# Altium integrated library myIOT_lib.IntLib: 300 symbols (part 1 of 3)
Pins are listed as number, name and electrical type; pins without a type are passive.

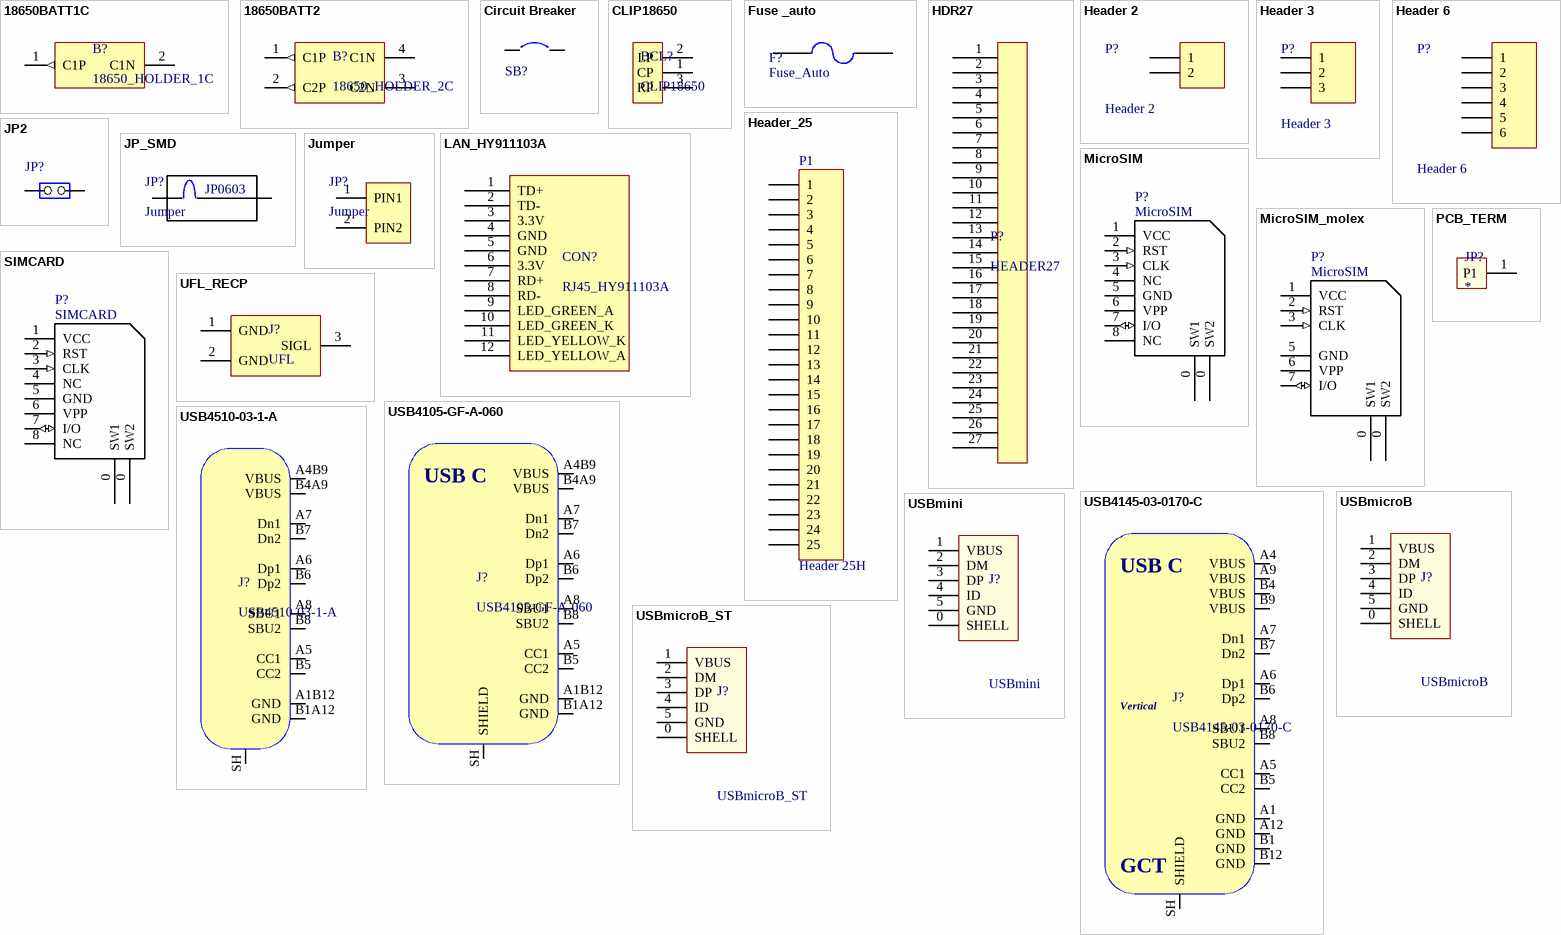
[diagram p0: symbols 18650BATT1C to USBmini]

## 18650BATT1C
designator B?, comment 18650_HOLDER_1C
18650 Battery 1 Cell Holder SMD
footprint 18650BAT1C_SMD (Battery 18650 Holder 1 Cell)
pins: 1 C1P (out), 2 C1N

## 18650BATT2
designator B?, comment 18650_HOLDER_2C
18650 Battery 2 Cell Holder SMD
footprint 18650BATT2 (18650 Battery Holder 2 Cell)
pins: 1 C1P (out), 2 C2P (out), 3 C2N, 4 C1N

## Circuit Breaker
designator SB?  (value not drawn)
Solder: NO; Published: 24-Mar-1999; Revision: July-2002: Re-released for DXP Platform.; Publisher: Altium Limited
footprint SPST-2 (Circuit Breaker; 2 Leads)
footprint JP2_SMD
pins: 1, 2

## CLIP18650
designator BCL?
clip 18650
footprint CLIP18650 (battery clip 18650)
pins: 1 CP, 2 LP, 3 RP

## Fuse _auto
designator F?, comment Fuse_Auto
Automive Fuse Holder 19mm x5 mm; Published: 8-Jun-2000; LatestRevisionDate: 17-Jul-2002; LatestRevisionNote: Re-released for DXP Platform.; PackageReference: PIN-W2/E2.8; Publisher: Altium Limited; PackageDescription: Thru-Hole; 2 Leads
footprint Keystone_3557-2 (Automotive Fuse Holder 19mmx5mm)
pins: 1 IN, 2 OUT

## HDR27
designator P?, comment HEADER27
footprint HDR27 (2.54mm pitch HEADER)
pins: 1, 2, 3, 4, 5, 6, 7, 8, 9, 10, 11, 12, 13, 14, 15, 16, 17, 18, 19, 20, 21, 22, 23, 24, 25, 26, 27

## Header 2
designator P?
Header, 2-Pin; LatestRevisionDate: 17-Jul-2002; LatestRevisionNote: Re-released for DXP Platform.; Publisher: Altium Limited
footprint B2B-XH-A (WAFER Connector 2 Pins,Pitch 2.50mm, Straight Type  Single Row)
pins: 1, 2

## Header 3
designator P?
Header, 3-Pin; LatestRevisionDate: 17-Jul-2002; LatestRevisionNote: Re-released for DXP Platform.; Publisher: Altium Limited
footprint B3B-XH-A (WAFER Connector 3 Pins,Pitch 2.50mm, Straight Type  Single Row)
pins: 1, 2, 3

## Header 6
designator P?
Header, 6-Pin; LatestRevisionDate: 17-Jul-2002; LatestRevisionNote: Re-released for DXP Platform.; Publisher: Altium Limited
footprint B6B-XH-A (WAFER Connector 6 Pins,Pitch 2.50mm, Straight Type  Single Row)
pins: 1, 2, 3, 4, 5, 6

## Header_25
designator P1, comment Header 25H
Header, 25-Pin; LatestRevisionDate: 17-Jul-2002; LatestRevisionNote: Re-released for DXP Platform.; Publisher: Altium Limited
footprint HDR1X25M (Connector; Header; 25 Position)
pins: 1, 2, 3, 4, 5, 6, 7, 8, 9, 10, 11, 12, 13, 14, 15, 16, 17, 18, 19, 20, 21, 22, 23, 24, 25

## JP2
designator JP?
footprint SIP2/2.54
pins: 1 COMMON, 2 NO

## JP_SMD
designator JP?, comment Jumper  (net tie, no BOM)
Jumper SMD 0603 size
footprint JP0603 (Jumper Body 1.6 x 0.8 mm (LxW typ))
pins: 1 P1, 2 P2
text: JP0603

## Jumper
designator JP?
Small Jumper for (M) pin header pitch 2.0mm
footprint JUMPER2.0p (mini jumper pitch 2.0mm)
pins: 1 PIN1, 2 PIN2

## LAN_HY911103A
designator CON?, comment RJ45_HY911103A
ConnectorRJ45 Magnetic with 2 LEDfor 10/100; Anunda_Code: N2311
footprint LAN_HY911103A
pins: 1 TD+  , 2 TD-, 3 3.3V, 4 GND, 5 GND, 6 3.3V, 7 RD+, 8 RD-, 9 LED_GREEN_A, 10 LED_GREEN_K, 11 LED_YELLOW_K, 12 LED_YELLOW_A

## MicroSIM
designator P?
Connector for Micro SIM card ,8 pin, 1.27 mm pitch PCB SMT; MFG: AUK CONNECTOR; MFG P/N: SCPW06L20020-R5H-HCN; Anunda_Code: N1986; Price: 13.26; Supplier: AUK
footprint WE-693022010811 (8-pos Connector Micro SIM SMD, R/A ,Hinged Lid,Wurth Electronics)
pins: 0 SW1 (power), 0 SW2 (power), 1 VCC (power), 2 RST (in), 3 CLK (in), 4 NC, 5 GND (power), 6 VPP (power), 7 I/O (io), 8 NC

## MicroSIM_molex
designator P?, comment MicroSIM
Connector Micro SIM Card Hinged Lid 6-Contact 1.6mm Height; MFG: AUK CONNECTOR; MFG P/N: SCPW06L20020-R5H-HCN; Anunda_Code: D0920; Price: 13.26; Supplier: AUK
footprint MOLEX-788000001
pins: 0 SW1 (power), 0 SW2 (power), 1 VCC (power), 2 RST (in), 3 CLK (in), 5 GND (power), 6 VPP (power), 7 I/O (io)

## PCB_TERM
designator JP?
footprint PCB_TERM_TAB635
pins: 1 P1

## SIMCARD
designator P?
Connector for Multipole SIM card ,6 pin, 1.27 mm pitch PCB SMT; MFG: AUK CONNECTOR; MFG P/N: SCPW06L20020-R5H-HCN; Anunda_Code: N1025; Price: 13.26; Supplier: AUK
footprint MOLEX-0475532001 (Push-push SIM Socket)
pins: 0 SW1 (power), 0 SW2 (power), 1 VCC (power), 2 RST (in), 3 CLK (in), 4 NC, 5 GND (power), 6 VPP (power), 7 I/O (io), 8 NC

## UFL_RECP
designator J?, comment UFL
Connector UMCC IPEX MHF1 Receptacle (M) SMD 50 Ohm; Anunda_Code: D0696
footprint UFL_recep_SMT
pins: 1 GND, 2 GND, 3 SIGL

## USB4105-GF-A-060
designator J?
USB Connector Type C SMT 12 Pin; Manufacturer: GCT; Manufacturer Part Number: USB4105-GF-A-060
footprint USB4105-GF-A-060
pins: A1B12 GND, A4B9 VBUS, A5 CC1, A6 Dp1, A7 Dn1, A8 SBU1, B1A12 GND, B4A9 VBUS, B5 CC2, B6 Dp2, B7 Dn2, B8 SBU2, SH SHIELD
text: USB C

## USB4145-03-0170-C
designator J?
USB Connector Type C SMT 16 Pin Vertical; Manufacturer: GCT; Manufacturer Part Number: USB4145-03-0170-C
footprint USB4145-03-0170-C
pins: A1 GND, A4 VBUS, A5 CC1, A6 Dp1, A7 Dn1, A8 SBU1, A9 VBUS, A12 GND, B1 GND, B4 VBUS, B5 CC2, B6 Dp2, B7 Dn2, B8 SBU2, B9 VBUS, B12 GND, SH SHIELD
text: USB C; Vertical

## USB4510-03-1-A
designator J?
USB Connector Type C SMT Mid-Mount 16 Pin; Manufacturer: GCT; Manufacturer Part Number: USB4510-03-1-A
footprint USB4510-03-1-A
pins: A1B12 GND, A4B9 VBUS, A5 CC1, A6 Dp1, A7 Dn1, A8 SBU1, B1A12 GND, B4A9 VBUS, B5 CC2, B6 Dp2, B7 Dn2, B8 SBU2, SH SHIELD

## USBmicroB
designator J?
Micro USB 2.0 ReceptacleType B Connector 5 Position, R/A(Digikey:609-4618-1-ND); Anunda_Code: N1953
footprint microUSB_ mix_amPN
pins: 0 SHELL, 1 VBUS, 2 DM, 3 DP, 4 ID, 5 GND

## USBmicroB_ST
designator J?
Micro USB 2.0 ReceptacleType B Connector 5 Position, S/T(105133-0001); Anunda_Code: N2253
footprint microUSB_ mix_Standoff
pins: 0 SHELL, 1 VBUS, 2 DM, 3 DP, 4 ID, 5 GND

## USBmini
designator J?
USB mini type B 5 pins receptacle
footprint MiniUSBtype B
pins: 0 SHELL, 1 VBUS, 2 DM, 3 DP, 4 ID, 5 GND


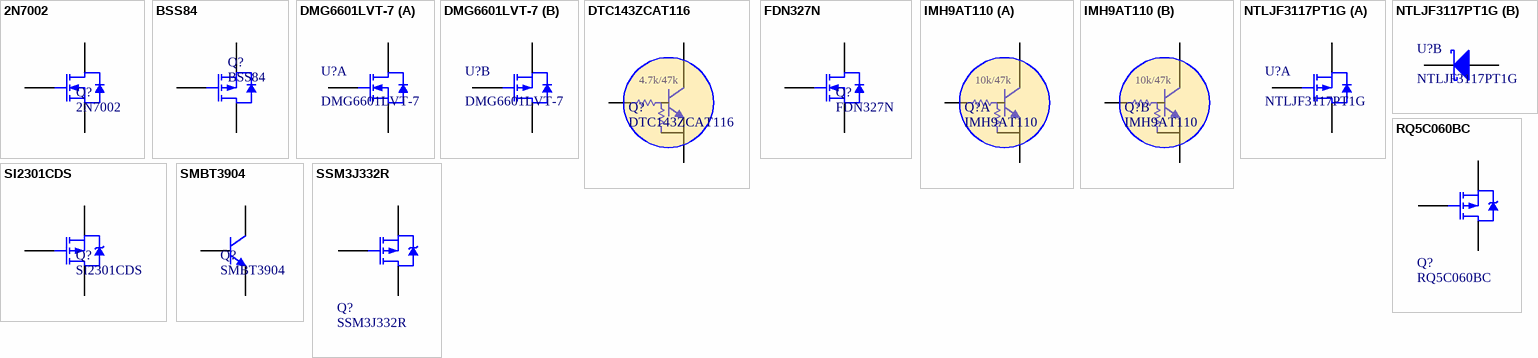
[diagram p1: symbols 2N7002 to SSM3J332R]

## 2N7002
designator Q?
N-channel Enhancement Mode Field-effect Transistor 2N7002; Anunda_Code: M1070; MFG: ON Semiconductor; MFG P/N: 2N7002LT1G; Published: 17-Sep-2003; LatestRevisionDate: 12-Dec-2006; LatestRevisionNote: IPC-7351 Footprint Added.; DatasheetVersion: 27-Jul-2000; PackageVersion: May-1999; PackageReference: SOT23; Publisher: Altium Limited; PackageDescription: 3-Pin SOT-23 Package 0.95 mm Pitch, 2.3 mm Lead Span; Value: 2N7002
simulation model 2N7002 (SUBCKT)
footprint SOT23_N_2
pins: 1 G, 2 S, 3 D

## BSS84
designator Q?
P-channel Enhancement Mode Vertical D-MOSFET BSS84; Anunda_Code: M1904; MFG: Nexperia USA Inc.; MFG P/N: BSS84AK,215; Published: 17-Sep-2003; LatestRevisionDate: 12-Dec-2006; LatestRevisionNote: IPC-7351 Footprint Added.; DatasheetVersion: 18-Jun-1997; PackageVersion: May-1999; PackageReference: SOT23; Publisher: Altium Limited; PackageDescription: 3-Pin SOT-23 Package 0.95 mm Pitch, 2.3 mm Lead Span; Value: BSS84
footprint SOT23_N_2
pins: 1 G, 2 S, 3 D

## DMG6601LVT-7
designator U?
DMG6601LVT-7COMPLEMENTARY PAIR ENHANCEMENT MODE MOSFET; Anunda_Code: M1914; MFG: Diode Incorporated; Value: DMG6601LVT-7; MFG P/N: DMG6601LVT-7
footprint SOT23-6
part A pins: 1 G1, 5 S1, 6 D1
part B pins: 2 S2, 3 G2, 4 D2

## DTC143ZCAT116
designator Q?
DTC143ZCAT116 / Digital Transistor NPN 50V/100mA, 200mW 4.7 kOhm and 47 kOhm Built-in Bias Resistors; Anunda_Code: M2034; ES P/N: 0176-1565-6; MFG: Rohm Semiconductor; Published: 17-Sep-2003; LatestRevisionDate: 12-Dec-2006; LatestRevisionNote: IPC-7351 Footprint Added.; DatasheetVersion: 13-May-2002; PackageVersion: May-1999; PackageReference: SOT23; Publisher: Altium Limited; PackageDescription: 3-Pin SOT-23 Package 0.95 mm Pitch, 2.3 mm Lead Span; Value: DTC143ZCAT116; MFG P/N: DTC143ZCAT116
footprint SOT23_N_2
pins: 1 B, 2 E, 3 C
text: 4.7k/47k

## FDN327N
designator Q?
Transistor FDN327N N-CH 20V 2A MOSFET 0.5W; Anunda_Code: M2008; MFG: ON Semiconductor; Published: 17-Sep-2003; LatestRevisionDate: 12-Dec-2006; LatestRevisionNote: IPC-7351 Footprint Added.; DatasheetVersion: 27-Jul-2000; PackageVersion: May-1999; PackageReference: SOT23; Publisher: Altium Limited; PackageDescription: 3-Pin SOT-23 Package 0.95 mm Pitch, 2.3 mm Lead Span; Value: FDN327N; MFG P/N: FDN327N
simulation model 2N7002 (SUBCKT)
footprint SOT23_N_2
pins: 1 G, 2 S, 3 D

## IMH9AT110
designator Q?
IMH9AT110 / Dual Digital Transistor NPN 50V/100mA,10kO and 47kO Built-in Bias Resistors; Anunda_Code: M2062; ES P/N: 0176-1565-6; MFG: Rohm Semiconductor; Published: 17-Sep-2003; LatestRevisionDate: 12-Dec-2006; LatestRevisionNote: IPC-7351 Footprint Added.; DatasheetVersion: 13-May-2002; PackageVersion: May-1999; PackageReference: SOT457-6; Publisher: Altium Limited; PackageDescription: 6-Pin SOT-457 Package 0.95 mm Pitch, 2.3 mm Lead Span; Value: IMH9AT110; MFG P/N: IMH9AT110
footprint SOT457-6 (SOT457, 6-Leads, Body 2.90x2.80mm, Pitch 0.95mm, IPC Medium Density)
part A pins: 2 B1, 3 E1, 4 C1
part B pins: 1 C2, 5 B2, 6 E2
part A text: 10k/47k
part B text: 10k/47k

## NTLJF3117PT1G
designator U?
Power MOSFET P-CH with Schottky Diode
footprint WDFN6_HS-7N (SON, 6-Leads, Body 2.00x2.00mm, Pitch 0.65mm, Thermal Pad 1.60x0.98mm, IPC Medium Density)
part A pins: 3 D, 4 S, 5 G
part B pins: 1 A, 6 K

## RQ5C060BC
designator Q?
P-Channel Power MOSFET RQ5C060BC; Note: Pin 4 not drawn and electrically connected to Pin 2.; Anunda_Code: M1937; MFG: Rohm Semiconductor; MFG P/N: RQ5C060BCTCL; Published: 8-Jun-2000; LatestRevisionDate: 17-Jul-2002; LatestRevisionNote: Re-released for DXP Platform.; DatasheetVersion: PD-9.390D; PackageVersion: Feb-1997; PackageReference: TO-220AB; Publisher: Altium Limited; PackageDescription: TO, Thru-Hole, Vertical, Heatsink Mounted; 3 In-Line Leads; Pitch 2.54 mm; Value: RQ5C060BC
simulation model IRF9510 (Spice Subcircuit)
footprint SOT-23(SOT-23-3)
pins: 1 G, 2 S, 3 D

## SI2301CDS
designator Q?
SI2301CDS  P-Channel 20V 3.1A (Tc) 860mW (Ta), 1.6W (Tc) Surface Mount SOT-23-3 (TO-236); Note: Pin 4 not drawn and electrically connected to Pin 2.; Published: 8-Jun-2000; LatestRevisionDate: 17-Jul-2002; LatestRevisionNote: Re-released for DXP Platform.; DatasheetVersion: PD-9.390D; PackageVersion: Feb-1997; PackageReference: TO-220AB; Publisher: Altium Limited; Digi-Key: SI2301CDS-T1-GE3CT-ND
footprint SOT23_N_2
pins: 1 G, 2 S, 3 D

## SMBT3904
designator Q?
NPN Switching Transistor  SMBT3904 SOT-23; Anunda_Code: M0292; MFG: Diode Incorporated; MFG P/N: MMBT3904-7-F; Published: 17-Sep-2003; LatestRevisionDate: 12-Dec-2006; LatestRevisionNote: IPC-7351 Footprint Added.; DatasheetVersion: 13-May-2002; PackageVersion: May-1999; PackageReference: SOT23; Publisher: Altium Limited; PackageDescription: 3-Pin SOT-23 Package 0.95 mm Pitch, 2.3 mm Lead Span; Value: SMBT3904
footprint SOT23_N_2
pins: 1 B, 2 E, 3 C

## SSM3J332R
designator Q?
P-Channel Power MOSFET 30V/6A SSM3J332R; Note: Pin 4 not drawn and electrically connected to Pin 2.; Anunda_Code: M2161; MFG: Toshiba Semiconductor and Storage; MFG P/N: SSM3J332R,LF; Published: 8-Jun-2000; LatestRevisionDate: 17-Jul-2002; LatestRevisionNote: Re-released for DXP Platform.; DatasheetVersion: PD-9.390D; PackageVersion: Feb-1997; PackageReference: SOT-23F; Publisher: Altium Limited; PackageDescription: TO, Thru-Hole, Vertical, Heatsink Mounted; 3 In-Line Leads; Pitch 2.54 mm; Value: SSM3J332R
simulation model IRF9510 (Spice Subcircuit)
footprint SOT-23(SOT-23-3)
pins: 1 G, 2 S, 3 D


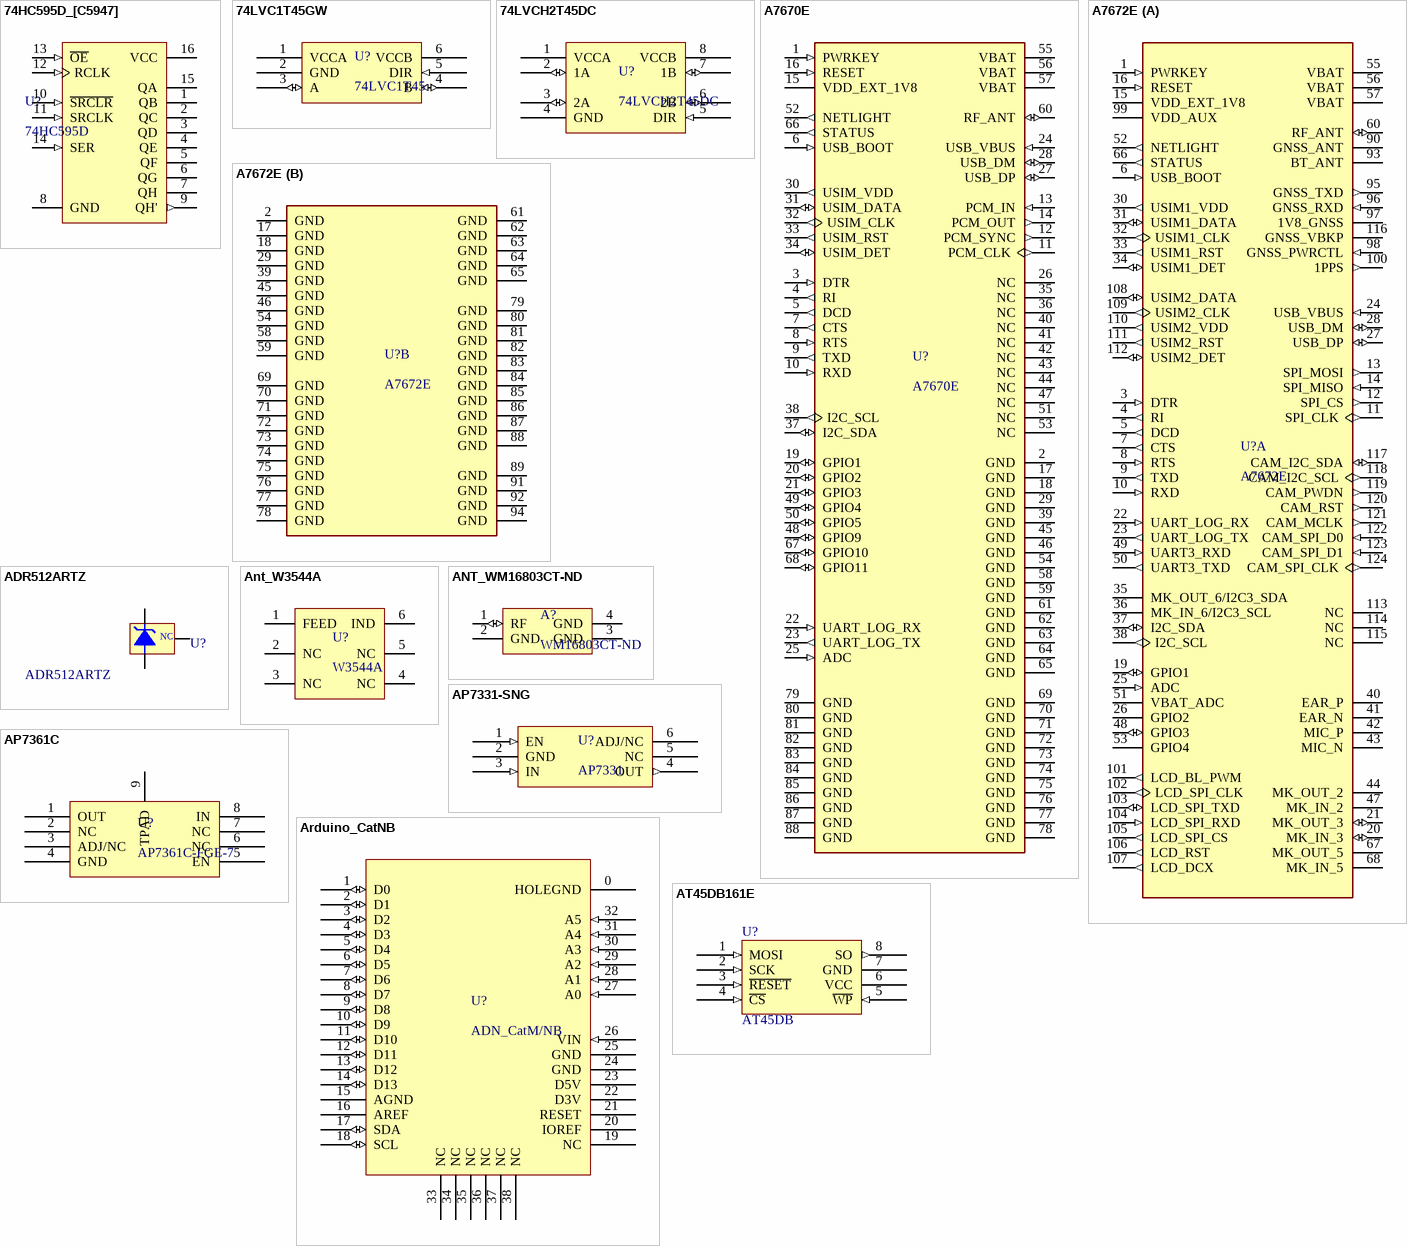
[diagram p2: symbols 74HC595D_[C5947] to AT45DB161E]

## 74HC595D_[C5947]
designator U?, comment 74HC595D
Package: SOIC-16_150mil; Supplier: LC; SuppliersPartNumber: C5947
footprint SOIC-16_150mil
pins: 1 QB (hiz), 2 QC (hiz), 3 QD (hiz), 4 QE (hiz), 5 QF (hiz), 6 QG (hiz), 7 QH (hiz), 8 GND (power), 9 QH' (out), 10 ~{SRCLR} (in), 11 SRCLK (in), 12 RCLK (in), 13 ~{OE} (in), 14 SER (in), 15 QA (hiz), 16 VCC (power)

## 74LVC1T45GW
designator U?, comment 74LVC1T45
IC 74LVC1T45GW-W100H Level Translator 6-TSSOP; Anunda_Code: M2037; DigiKey_PN:: 1727-8054-1-ND
footprint SOT363 (SOT363, 6-Leads, Body 2.00x2.10mm, Pitch 0.65mm, IPC Medium Density)
pins: 1 VCCA, 2 GND, 3 A (io), 4 B (io), 5 DIR (in), 6 VCCB

## 74LVCH2T45DC
designator U?
IC 74LVCH2T45DC-Q100H Level Translator VSSOP-8; DigiKey_PN:: 1727-8054-1-ND
footprint VSSOP-8 (TSSOP, 8-Leads, Body 2.00x2.30mm, Pitch 0.50mm, IPC Medium Density)
pins: 1 VCCA, 2 1A (io), 3 2A (io), 4 GND, 5 DIR (in), 6 2B (io), 7 1B (io), 8 VCCB

## A7670E
designator U?
4G LTE Module, SIMCOM A7670E; MP: A7670E; Package: None; MF: Simcom; Value: *; Price: None; SnapEDA_Link: https://www.snapeda.com/parts/SIM7600E-H/SIMcom%20Wireless%20solutions%20Co.%2CLtd/view-part/2758290/?ref=snap; Anunda_Code: *
footprint A7670X (LCC+LGA Package 88pin)
pins: 1 PWRKEY (in), 2 GND (power), 3 DTR (in), 4 RI (out), 5 DCD (out), 6 USB_BOOT (in), 7 CTS (out), 8 RTS (in), 9 TXD (out), 10 RXD (in), 11 PCM_CLK (out), 12 PCM_SYNC (out), 13 PCM_IN (in), 14 PCM_OUT (out), 15 VDD_EXT_1V8 (power), 16 RESET (in), 17 GND (power), 18 GND (power), 19 GPIO1 (io), 20 GPIO2 (io), 21 GPIO3 (io), 22 UART_LOG_RX (in), 23 UART_LOG_TX (out), 24 USB_VBUS (in), 25 ADC (in), 26 NC, 27 USB_DP (io), 28 USB_DM (io), 29 GND (power), 30 USIM_VDD (out), 31 USIM_DATA (io), 32 USIM_CLK (out), 33 USIM_RST (out), 34 USIM_DET (io), 35 NC, 36 NC, 37 I2C_SDA (io), 38 I2C_SCL (out), 39 GND (power), 40 NC, 41 NC, 42 NC, 43 NC, 44 NC, 45 GND (power), 46 GND (power), 47 NC, 48 GPIO9 (io), 49 GPIO4 (io), 50 GPIO5 (io), 51 NC, 52 NETLIGHT (out), 53 NC, 54 GND (power), 55 VBAT (power), 56 VBAT (power), 57 VBAT (power), 58 GND (power), 59 GND (power), 60 RF_ANT (io), 61 GND (power), 62 GND (power), 63 GND (power), 64 GND (power), 65 GND (power), 66 STATUS (out), 67 GPIO10 (io), 68 GPIO11 (io), 69 GND (power), 70 GND (power), 71 GND (power), 72 GND (power), 73 GND (power), 74 GND (power), 75 GND (power), 76 GND (power), 77 GND (power), 78 GND (power), 79 GND (power), 80 GND (power), 81 GND (power), 82 GND (power), 83 GND (power), 84 GND (power), 85 GND (power), 86 GND (power), 87 GND (power), 88 GND (power)

## A7672E
designator U?
4G LTE Module, SIMCOM A7672E; MP: A7672E; Package: None; MF: Simcom; Value: *; Price: None; SnapEDA_Link: https://www.snapeda.com/parts/SIM7600E-H/SIMcom%20Wireless%20solutions%20Co.%2CLtd/view-part/2758290/?ref=snap; Anunda_Code: *
footprint A7672X (LCC+LGA Package 124pin)
part A pins: 1 PWRKEY (in), 3 DTR (in), 4 RI (out), 5 DCD (out), 6 USB_BOOT (in), 7 CTS (out), 8 RTS (in), 9 TXD (out), 10 RXD (in), 11 SPI_CLK (out), 12 SPI_CS (out), 13 SPI_MOSI (out), 14 SPI_MISO (in), 15 VDD_EXT_1V8 (power), 16 RESET (in), 19 GPIO1 (io), 20 MK_IN_3 (io), 21 MK_OUT_3 (io), 22 UART_LOG_RX (in), 23 UART_LOG_TX (out), 24 USB_VBUS (in), 25 ADC (in), 26 GPIO2, 27 USB_DP (io), 28 USB_DM (io), 30 USIM1_VDD (out), 31 USIM1_DATA (io), 32 USIM1_CLK (out), 33 USIM1_RST (out), 34 USIM1_DET (io), 35 MK_OUT_6/I2C3_SDA, 36 MK_IN_6/I2C3_SCL, 37 I2C_SDA (io), 38 I2C_SCL (out), 40 EAR_P, 41 EAR_N, 42 MIC_P, 43 MIC_N, 44 MK_OUT_2, 47 MK_IN_2, 48 GPIO3 (io), 49 UART3_RXD (in), 50 UART3_TXD (out), 51 VBAT_ADC, 52 NETLIGHT (out), 53 GPIO4, 55 VBAT (power), 56 VBAT (power), 57 VBAT (power), 60 RF_ANT (io), 66 STATUS (out), 67 MK_OUT_5, 68 MK_IN_5, 90 GNSS_ANT (power), 93 BT_ANT (power), 95 GNSS_TXD (out), 96 GNSS_RXD (in), 97 1V8_GNSS (power), 98 GNSS_PWRCTL (in), 99 VDD_AUX (power), 100 1PPS (out), 101 LCD_BL_PWM (out), 102 LCD_SPI_CLK (out), 103 LCD_SPI_TXD (io), 104 LCD_SPI_RXD (in), 105 LCD_SPI_CS (out), 106 LCD_RST (out), 107 LCD_DCX (out), 108 USIM2_DATA (io), 109 USIM2_CLK (out), 110 USIM2_VDD (out), 111 USIM2_RST (out), 112 USIM2_DET (io), 113 NC, 114 NC, 115 NC, 116 GNSS_VBKP (power), 117 CAM_I2C_SDA (io), 118 CAM_I2C_SCL (out), 119 CAM_PWDN (out), 120 CAM_RST (out), 121 CAM_MCLK (out), 122 CAM_SPI_D0 (in), 123 CAM_SPI_D1 (in), 124 CAM_SPI_CLK (out)
part B pins: 2 GND (power), 17 GND (power), 18 GND (power), 29 GND (power), 39 GND (power), 45 GND (power), 46 GND (power), 54 GND (power), 58 GND (power), 59 GND (power), 61 GND (power), 62 GND (power), 63 GND (power), 64 GND (power), 65 GND (power), 69 GND (power), 70 GND (power), 71 GND (power), 72 GND (power), 73 GND (power), 74 GND (power), 75 GND (power), 76 GND (power), 77 GND (power), 78 GND (power), 79 GND (power), 80 GND (power), 81 GND (power), 82 GND (power), 83 GND (power), 84 GND (power), 85 GND (power), 86 GND (power), 87 GND (power), 88 GND (power), 89 GND (power), 91 GND (power), 92 GND (power), 94 GND (power)

## ADR512ARTZ
designator U?
ADR512ARTZ VRef Shunt Precision 1.2V SOT-23-3
footprint SOT23_N_2
pins: 1 K, 2 A, 3 NC

## Ant_W3544A
designator U?, comment W3544A
LTE Antenna (W3544A) 850-900/1710-2170MHz PCB Trace; Anunda_Code: N2212
footprint W3544A (PulseLarsen W3544A GSM/3G Antenna)
pins: 1 FEED, 2 NC, 3 NC, 4 NC, 5 NC, 6 IND

## ANT_WM16803CT-ND
designator A?, comment WM16803CT-ND
SMD Ant. molex WM16803CT-ND
footprint WM16803CT-ND (molex gps ant)
pins: 1 RF (io), 2 GND, 3 GND, 4 GND

## AP7331-SNG
designator U?, comment AP7331
300mA, LOW QUIESCENT CU  RRENT, FAST TRANSIENT   LOW DROPOUT LINEAR REGULATOR
footprint DFN2020-6_HS-7N (SON, 6-Leads, Body 2.01x2.01mm, Pitch 0.65mm, Thermal Pad 1.55x0.73mm, IPC Medium Density)
pins: 1 EN (in), 2 GND, 3 IN (in), 4 OUT (out), 5 NC, 6 ADJ/NC

## AP7361C
designator U?, comment AP7361C-FGE-7
AP7361C-FGE-7   Low Dropout Adjustable 1A Regulator; Anunda_Code: M1966; Value: AP7361C-FGE-7
footprint U-DFN3030-8 (SON, 8-Leads, Body 3.00x3.00mm, Pitch 0.65mm, Thermal Pad 2.25x1.34mm, IPC Medium Density)
pins: 1 OUT, 2 NC, 3 ADJ/NC, 4 GND, 5 EN, 6 NC, 7 NC, 8 IN, 9 TPAD

## Arduino_CatNB
designator U?, comment ADN_CatM/NB
Arduino Shield Cat.M1/NB
footprint ADN_NB (Arduino Shield Cat. M1/NB)
pins: 0 HOLEGND, 1 D0 (io), 2 D1 (io), 3 D2 (io), 4 D3 (io), 5 D4 (io), 6 D5 (io), 7 D6 (io), 8 D7 (io), 9 D8 (io), 10 D9 (io), 11 D10 (io), 12 D11 (io), 13 D12 (io), 14 D13 (io), 15 AGND, 16 AREF, 17 SDA (io), 18 SCL (io), 19 NC, 20 IOREF, 21 RESET, 22 D3V (power), 23 D5V (power), 24 GND, 25 GND, 26 VIN (in), 27 A0 (in), 28 A1 (in), 29 A2 (in), 30 A3 (in), 31 A4 (in), 32 A5 (in), 33 NC, 34 NC, 35 NC, 36 NC, 37 NC, 38 NC

## AT45DB161E
designator U?, comment AT45DB
AT45DB161E-SUD-T Flash Memory 16M, 2.5-3.6V SPI SOIC-8; Anunda_Code: M1909
footprint SOIC-8_208mil
pins: 1 MOSI (in), 2 SCK (in), 3 ~{RESET} (in), 4 ~{CS} (in), 5 ~{WP} (in), 6 VCC (power), 7 GND, 8 SO (out)

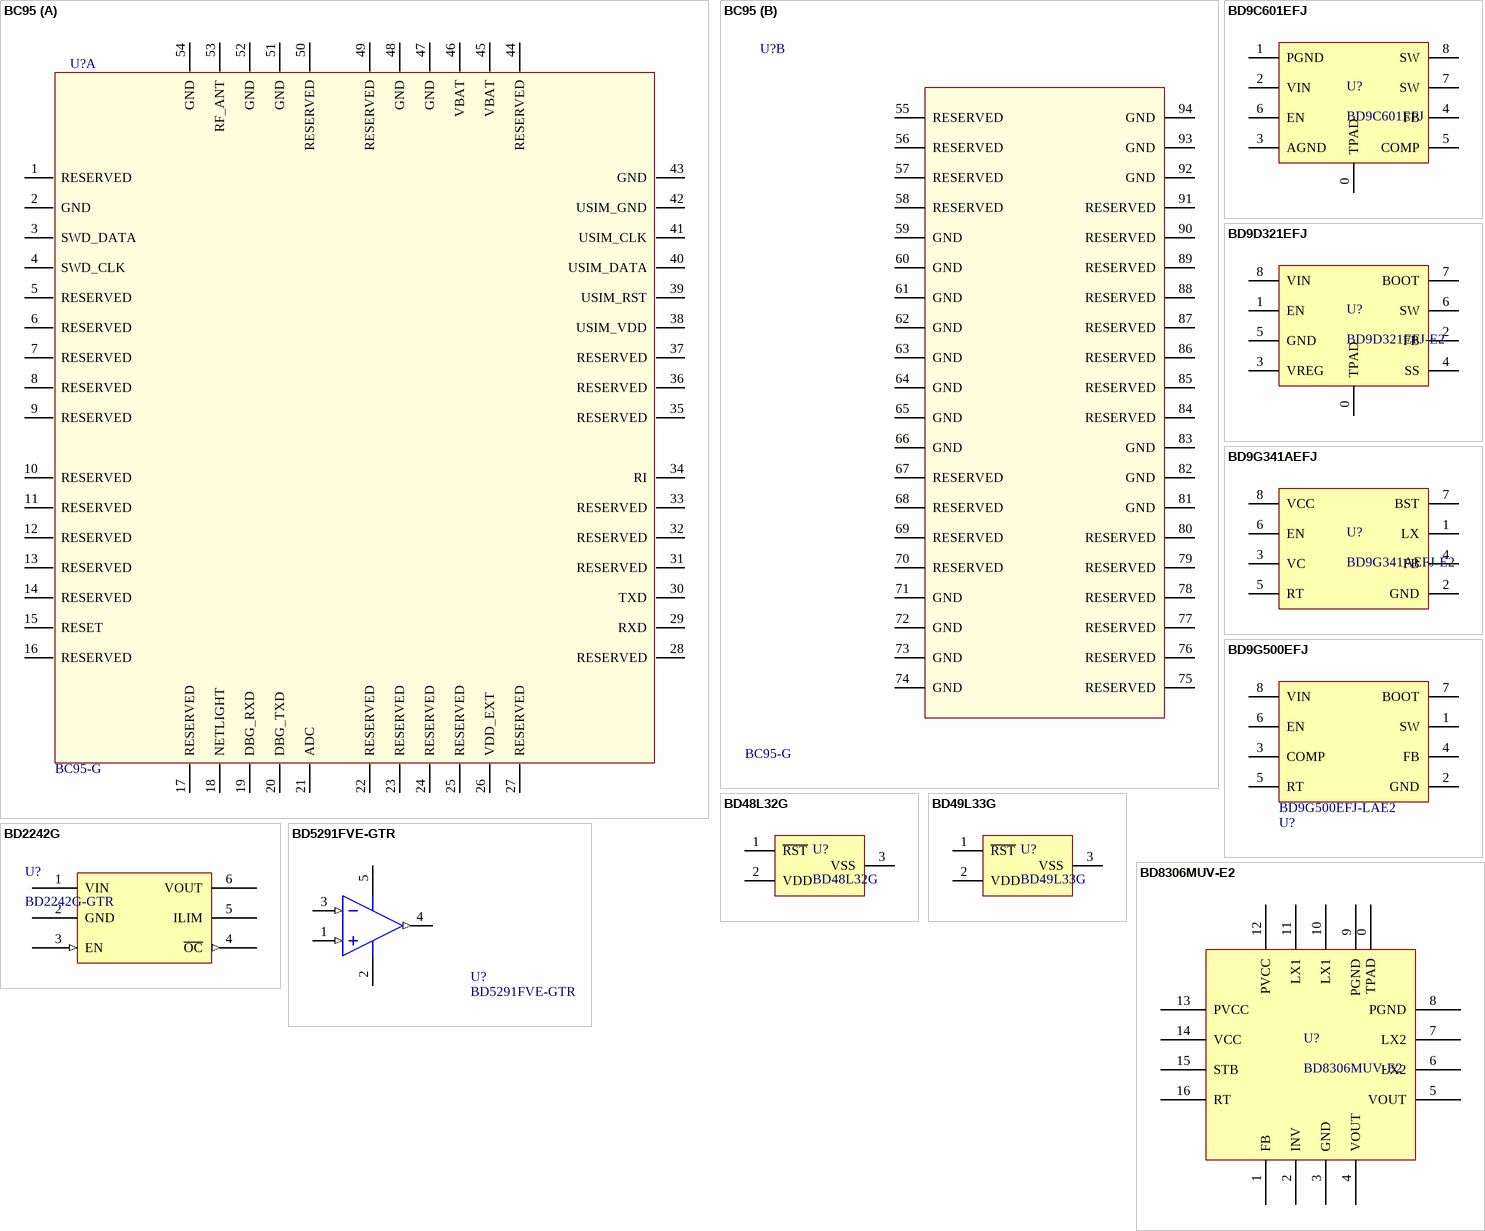
[diagram p3: symbols BC95 to BD8306MUV-E2]

## BC95
designator U?, comment BC95-G
LTE  NB-IoT Module, Model : BC95-G, Quectel; Anunda_Code: N2123; Value: *; Part Description: *; PCB DECAL: *
footprint BC95
part A pins: 1 RESERVED, 2 GND, 3 SWD_DATA, 4 SWD_CLK, 5 RESERVED, 6 RESERVED, 7 RESERVED, 8 RESERVED, 9 RESERVED, 10 RESERVED, 11 RESERVED, 12 RESERVED, 13 RESERVED, 14 RESERVED, 15 RESET, 16 RESERVED, 17 RESERVED, 18 NETLIGHT, 19 DBG_RXD, 20 DBG_TXD, 21 ADC, 22 RESERVED, 23 RESERVED, 24 RESERVED, 25 RESERVED, 26 VDD_EXT, 27 RESERVED, 28 RESERVED, 29 RXD, 30 TXD, 31 RESERVED, 32 RESERVED, 33 RESERVED, 34 RI, 35 RESERVED, 36 RESERVED, 37 RESERVED, 38 USIM_VDD, 39 USIM_RST, 40 USIM_DATA, 41 USIM_CLK, 42 USIM_GND, 43 GND, 44 RESERVED, 45 VBAT, 46 VBAT, 47 GND, 48 GND, 49 RESERVED, 50 RESERVED, 51 GND, 52 GND, 53 RF_ANT, 54 GND
part B pins: 55 RESERVED, 56 RESERVED, 57 RESERVED, 58 RESERVED, 59 GND, 60 GND, 61 GND, 62 GND, 63 GND, 64 GND, 65 GND, 66 GND, 67 RESERVED, 68 RESERVED, 69 RESERVED, 70 RESERVED, 71 GND, 72 GND, 73 GND, 74 GND, 75 RESERVED, 76 RESERVED, 77 RESERVED, 78 RESERVED, 79 RESERVED, 80 RESERVED, 81 GND, 82 GND, 83 GND, 84 RESERVED, 85 RESERVED, 86 RESERVED, 87 RESERVED, 88 RESERVED, 89 RESERVED, 90 RESERVED, 91 RESERVED, 92 GND, 93 GND, 94 GND
2 alternate drawings of the same symbol

## BD9C601EFJ
designator U?
footprint HTSOP-J8 (TSOP, 8-Leads, Body 4.90x3.90mm, Pitch 1.27mm, Thermal Pad 3.20x2.40mm, IPC Medium Density)
pins: 0 TPAD, 1 PGND, 2 VIN, 3 AGND, 4 FB, 5 COMP, 6 EN, 7 SW, 8 SW

## BD9D321EFJ
designator U?, comment BD9D321EFJ-E2
IC BD9D321EFJ-E2 Buck Converter 0.765-7V 3A HTSOP-J8; Anunda_Code: D1094; MFG: Rohm Semiconductor; MFG P/N: BD9D321EFJ-E2; Value: BD9D321EFJ-E2
footprint HTSOP-J8 (TSOP, 8-Leads, Body 4.90x3.90mm, Pitch 1.27mm, Thermal Pad 3.20x2.40mm, IPC Medium Density)
pins: 0 TPAD, 1 EN, 2 FB, 3 VREG, 4 SS, 5 GND, 6 SW, 7 BOOT, 8 VIN

## BD9G341AEFJ
designator U?, comment BD9G341AEFJ-E2
IC BD9G341AEFJ-E2 REGULATOR 12-76V 3A; Anunda_Code: M2139; MFG: Rohm Semiconductor; Value: BD9G341AEFJ-E2; MFG P/N: BD9G341AEFJ-E2
footprint HTSOP-J8 (TSOP, 8-Leads, Body 4.90x3.90mm, Pitch 1.27mm, Thermal Pad 3.20x2.40mm, IPC Medium Density)
pins: 0 TPAD hidden to TPAD "Thermal Pad Net", 1 LX, 2 GND, 3 VC, 4 FB, 5 RT, 6 EN, 7 BST, 8 VCC

## BD9G500EFJ
designator U?, comment BD9G500EFJ-LAE2
IC BD9G500EFJ-LAE2 REGULATOR 12-76V 5A; Anunda_Code: M2159; MFG: Rohm Semiconductor; Value: BD9G500EFJ-LAE2; MFG P/N: BD9G500EFJ-LAE2
footprint HTSOP-J8 (TSOP, 8-Leads, Body 4.90x3.90mm, Pitch 1.27mm, Thermal Pad 3.20x2.40mm, IPC Medium Density)
pins: 0 TPAD hidden to TPAD "Thermal Pad Net", 1 SW, 2 GND, 3 COMP, 4 FB, 5 RT, 6 EN, 7 BOOT, 8 VIN

## BD48L32G
designator U?
BD48L32G  Voltage Supervisor 3.2V,Open Drain ,Active LOW; Anunda_Code: M2002; Value: BD48L32G
footprint SOT23_N_2
pins: 1 ~{RST}, 2 VDD, 3 VSS

## BD49L33G
designator U?
IC BD49L33G-TL Power Management 1-CH 3-SSOP; Anunda_Code: M2025; Value: BD49L33G
footprint SOT23_N_2
pins: 1 ~{RST}, 2 VDD, 3 VSS

## BD2242G
designator U?, comment BD2242G-GTR
1ch Adjustable Current Limit High Side Switch ICs, Open-Drain Fault Flag Output,Active-High Control Input Logic,Soft-Start Circuit; MFG: Rohm Semiconductor; Value: BD2242G-GTR; Anunda_Code: *; MFG P/N: BD2242G-GTR
footprint SOT-23-6
pins: 1 VIN (power), 2 GND, 3 EN (in), 4 ~{OC} (out), 5 ILIM, 6 VOUT (power)
